# Altium footprint library DBLib.PcbLib: 99 footprints (part 6 of 7)
Each footprint in its own frame and in the unit in brackets; x right, y up, seen from the top. Pads: shape width x height; smd on the part's side, far side on the other; paste and mask are expansions set on the pad; w line width, h text height; cw(c..) or ccw(c..) is an arc to the next point about the centre after c.
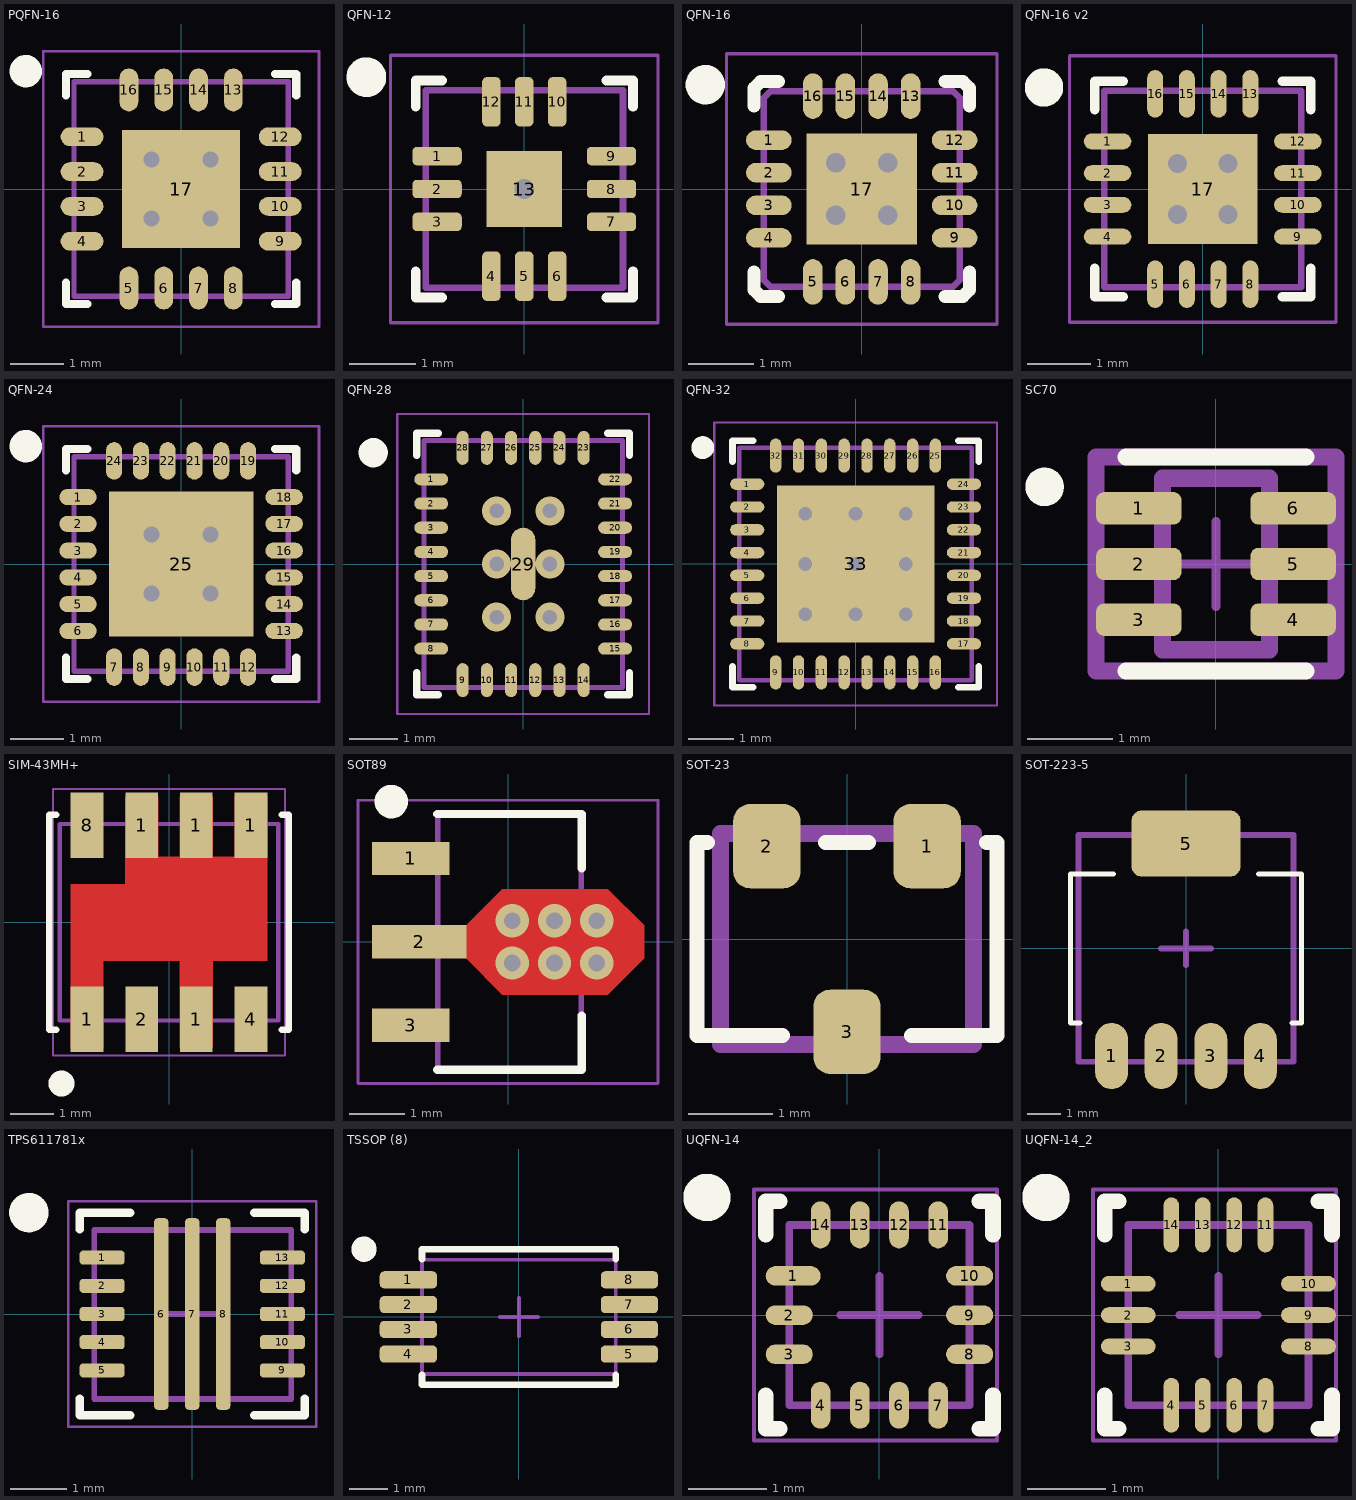
[diagram p5: the footprints below, top view; thin cyan lines are the x and y axes]

## PQFN-16 [mm] "PQFN, 16-Leads, Body 4,00x4,00mm, Pitch 0,65mm, Thermal Pad 2,15x2,15mm, IPC Medium Density"
height 0.8
pads (17):
  oval 0.8x0.35 smd: 1(-1.85,0.975) 2(-1.85,0.325) 3(-1.85,-0.325) 4(-1.85,-0.975) 9(1.85,-0.975) 10(1.85,-0.325) 11(1.85,0.325) 12(1.85,0.975)
  oval 0.35x0.8 smd: 5(-0.975,-1.85) 6(-0.325,-1.85) 7(0.325,-1.85) 8(0.975,-1.85) 13(0.975,1.85) 14(0.325,1.85) 15(-0.325,1.85) 16(-0.975,1.85)
  rect 2.2x2.2 all layers, no hole mask+0.102: 17(0,0)
via 0.55,0.55 diameter 0.6 hole 0.3
via -0.55,0.55 diameter 0.6 hole 0.3
via -0.55,-0.55 diameter 0.6 hole 0.3
via 0.55,-0.55 diameter 0.6 hole 0.3
Top Overlay:
  circle w0.35: c-2.9,2.2 r0.127
  lines w0.15: -2.15,-1.75 -2.15,-2.15 -1.75,-2.15 ; -2.15,1.75 -2.15,2.15 -1.75,2.15 ; 1.75,-2.15 2.15,-2.15 2.15,-1.75 ; 1.75,2.15 2.15,2.15 2.15,1.75
Mechanical 1:
  lines w0.05: -2.575,-2.575 2.575,-2.575 2.575,2.575 -2.575,2.575 -2.575,-2.575
  lines w0.1: -0.5,0 0.5,0 ; 0,-0.5 0,0.5 ; -2,-2 2,-2 2,2 -2,2 -2,-2
3D body "ALSRobot-QFN16 4x4.step": height 0.92, standoff 0, extent -2,-2 2,2

## QFN-12 [mm]
pads (13):
  rrect50% 0.75x0.28 smd: 1(-1.325,0.5) 2(-1.325,0) 3(-1.325,-0.5) 7(1.325,-0.5) 8(1.325,0) 9(1.325,0.5)
  rrect50% 0.28x0.75 smd: 4(-0.5,-1.325) 5(0,-1.325) 6(0.5,-1.325) 10(0.5,1.325) 11(0,1.325) 12(-0.5,1.325)
  rect 1.15x1.15 all layers, no hole mask+0.102: 13(0,0)
via 0,0 diameter 0.6 hole 0.3
Top Overlay:
  circle w0.35: c-2.4,1.7 r0.127
  lines w0.15: -1.65,-1.25 -1.65,-1.65 -1.25,-1.65 ; -1.65,1.25 -1.65,1.65 -1.25,1.65 ; 1.25,-1.65 1.65,-1.65 1.65,-1.25 ; 1.25,1.65 1.65,1.65 1.65,1.25
Mechanical 1:
  lines w0.05: -2.032,-2.032 -2.032,2.032 2.032,2.032 2.032,-2.032 -2.032,-2.032
  lines w0.1: -0.5,0 0.5,0 ; 0,-0.5 0,0.5 ; -1.5,-1.5 -1.5,1.5 1.5,1.5 1.5,-1.5 -1.5,-1.5
3D body "User Library-QFN12_05.step": height 0.9, standoff 0, extent -1.505,-1.505 1.505,1.505

## QFN-16 [mm] "QFN, 16-Leads, Body 3,00x3,00mm, Pitch 0,50mm, Thermal Pad 1,70x1,70mm, IPC Medium Density"
height 0.9
pads (17):
  oval 0.7x0.3 smd: 1(-1.425,0.75) 2(-1.425,0.25) 3(-1.425,-0.25) 4(-1.425,-0.75) 9(1.425,-0.75) 10(1.425,-0.25) 11(1.425,0.25) 12(1.425,0.75)
  oval 0.3x0.7 smd: 5(-0.75,-1.425) 6(-0.25,-1.425) 7(0.25,-1.425) 8(0.75,-1.425) 13(0.75,1.425) 14(0.25,1.425) 15(-0.25,1.425) 16(-0.75,1.425)
  rect 1.7x1.7 all layers, no hole mask+0.102: 17(0,0)
via -0.4,0.4 diameter 0.6 hole 0.3
via -0.4,-0.4 diameter 0.6 hole 0.3
via 0.4,-0.4 diameter 0.6 hole 0.3
via 0.4,0.4 diameter 0.6 hole 0.3
Top Overlay:
  circle w0.35: c-2.4,1.6 r0.127
  lines w0.2: -1.65,-1.275 -1.65,-1.55 -1.55,-1.65 -1.275,-1.65 ; -1.65,1.275 -1.65,1.55 -1.55,1.65 -1.275,1.65 ; 1.275,-1.65 1.55,-1.65 1.65,-1.55 1.65,-1.275 ; 1.275,1.65 1.55,1.65 1.65,1.55 1.65,1.275
Mechanical 1:
  lines w0.05: -2.075,-2.075 2.075,-2.075 2.075,2.075 -2.075,2.075 -2.075,-2.075
  lines w0.1: -0.5,0 0.5,0 ; 0,-0.5 0,0.5 ; -1.5,-1.4 -1.5,1.4 -1.4,1.5 1.4,1.5 1.5,1.4 1.5,-1.4 1.4,-1.5 -1.4,-1.5 -1.5,-1.4
3D body "User Library-qfn16-3x3.step": height 0.92, standoff 0, extent -1.5,-1.5 1.5,1.5

## QFN-16 v2 [mm] "QFN, 16-Leads, Body 3,00x3,00mm, Pitch 0,50mm, Thermal Pad 1,73x1,73mm, IPC Medium Density"
height 1
pads (17):
  oval 0.75x0.25 smd: 1(-1.5,0.75) 2(-1.5,0.25) 3(-1.5,-0.25) 4(-1.5,-0.75) 9(1.5,-0.75) 10(1.5,-0.25) 11(1.5,0.25) 12(1.5,0.75)
  oval 0.25x0.75 smd: 5(-0.75,-1.5) 6(-0.25,-1.5) 7(0.25,-1.5) 8(0.75,-1.5) 13(0.75,1.5) 14(0.25,1.5) 15(-0.25,1.5) 16(-0.75,1.5)
  rect 1.73x1.73 all layers, no hole mask+0.102: 17(0,0)
via 0.4,0.4 diameter 0.6 hole 0.3
via 0.4,-0.4 diameter 0.6 hole 0.3
via -0.4,-0.4 diameter 0.6 hole 0.3
via -0.4,0.4 diameter 0.6 hole 0.3
Top Overlay:
  circle w0.35: c-2.5,1.6 r0.127
  lines w0.15: -1.7,-1.25 -1.7,-1.7 -1.25,-1.7 ; -1.7,1.25 -1.7,1.7 -1.25,1.7 ; 1.25,-1.7 1.7,-1.7 1.7,-1.25 ; 1.25,1.7 1.7,1.7 1.7,1.25
Mechanical 1:
  lines w0.05: -2.1,-2.1 -2.1,2.1 2.1,2.1 2.1,-2.1 -2.1,-2.1
  lines w0.1: -0.5,0 0.5,0 ; 0,-0.5 0,0.5 ; -1.55,-1.55 -1.55,1.55 1.55,1.55 1.55,-1.55 -1.55,-1.55
3D body "User Library-HMC713LP3.step": height 1, standoff 0, extent -1.5,-1.5 1.5,1.5

## QFN-24 [mm] "QFN, 24-Leads, Body 4,00x4,00mm, Pitch 0,50mm, Thermal Pad 2,70x2,70mm, IPC Medium Density"
height 0.9
pads (25):
  oval 0.7x0.3 smd: 1(-1.925,1.25) 2(-1.925,0.75) 3(-1.925,0.25) 4(-1.925,-0.25) 5(-1.925,-0.75) 6(-1.925,-1.25) 13(1.925,-1.25) 14(1.925,-0.75) 15(1.925,-0.25) 16(1.925,0.25) 17(1.925,0.75) 18(1.925,1.25)
  oval 0.3x0.7 smd: 7(-1.25,-1.925) 8(-0.75,-1.925) 9(-0.25,-1.925) 10(0.25,-1.925) 11(0.75,-1.925) 12(1.25,-1.925) 19(1.25,1.925) 20(0.75,1.925) 21(0.25,1.925) 22(-0.25,1.925) 23(-0.75,1.925) 24(-1.25,1.925)
  rect 2.7x2.7 all layers, no hole mask+0.102: 25(0,0)
via 0.55,-0.55 diameter 0.6 hole 0.3
via -0.55,-0.55 diameter 0.6 hole 0.3
via -0.55,0.55 diameter 0.6 hole 0.3
via 0.55,0.55 diameter 0.6 hole 0.3
Top Overlay:
  circle w0.35: c-2.9,2.2 r0.127
  lines w0.15: -2.15,-1.75 -2.15,-2.15 -1.75,-2.15 ; -2.15,1.75 -2.15,2.15 -1.75,2.15 ; 1.75,-2.15 2.15,-2.15 2.15,-1.75 ; 1.75,2.15 2.15,2.15 2.15,1.75
Mechanical 1:
  lines w0.05: -2.575,-2.575 -2.575,2.575 2.575,2.575 2.575,-2.575 -2.575,-2.575
  lines w0.1: -0.5,0 0.5,0 ; 0,-0.5 0,0.5 ; -2,-2 -2,2 2,2 2,-2 -2,-2
3D body "User Library-QFN24.step": height 0.9, standoff 0, extent -2.005,-2.005 2.005,2.005

## QFN-28 [mm] "QFN, 28-Leads, Body 4,00x5,00mm, Pitch 0,50mm, Thermal Pad 2,50x3,50mm, IPC Medium Density"
height 0.9
pads (29):
  oval 0.7x0.25 smd: 1(-1.9,1.75) 2(-1.9,1.25) 3(-1.9,0.75) 4(-1.9,0.25) 5(-1.9,-0.25) 6(-1.9,-0.75) 7(-1.9,-1.25) 8(-1.9,-1.75) 15(1.9,-1.75) 16(1.9,-1.25) 17(1.9,-0.75) 18(1.9,-0.25) 19(1.9,0.25) 20(1.9,0.75) 21(1.9,1.25) 22(1.9,1.75)
  oval 0.25x0.7 smd: 9(-1.25,-2.4) 10(-0.75,-2.4) 11(-0.25,-2.4) 12(0.25,-2.4) 13(0.75,-2.4) 14(1.25,-2.4) 23(1.25,2.4) 24(0.75,2.4) 25(0.25,2.4) 26(-0.25,2.4) 27(-0.75,2.4) 28(-1.25,2.4)
  oval 0.5x1.5 all layers, no hole mask+0.102: 29(0,0)
via 0.55,-1.1 diameter 0.6 hole 0.3
via -0.55,-1.1 diameter 0.6 hole 0.3
via 0.55,0 diameter 0.6 hole 0.3
via -0.55,0 diameter 0.6 hole 0.3
via 0.55,1.1 diameter 0.6 hole 0.3
via -0.55,1.1 diameter 0.6 hole 0.3
Top Overlay:
  circle w0.35: c-3.1,2.3 r0.127
  lines w0.15: -2.2,-2.25 -2.2,-2.7 -1.75,-2.7 ; -2.2,2.25 -2.2,2.7 -1.75,2.7 ; 1.75,-2.7 2.2,-2.7 2.2,-2.25 ; 1.75,2.7 2.2,2.7 2.2,2.25
Mechanical 1:
  lines w0.05: -2.6,-3.1 -2.6,3.1 2.6,3.1 2.6,-3.1 -2.6,-3.1
  lines w0.1: -0.5,0 0.5,0 ; 0,-0.5 0,0.5 ; -2.05,-2.55 -2.05,2.55 2.05,2.55 2.05,-2.55 -2.05,-2.55
Multi-Layer:
  region: -1.325,1.469 -1.325,-1.825 1.325,-1.825 1.325,1.825 -0.969,1.825
3D body "User Library-QFN 28.step": height 0.75, standoff 0, extent -2.005,-2.505 2.005,2.505

## QFN-32 [mm] "QFN, 32-Leads, Body 5,00x5,00mm, Pitch 0,50mm, Thermal Pad 3,45x3,45mm, IPC Medium Density"
height 0.75
pads (33):
  oval 0.75x0.25 smd: 1(-2.375,1.75) 2(-2.375,1.25) 3(-2.375,0.75) 4(-2.375,0.25) 5(-2.375,-0.25) 6(-2.375,-0.75) 7(-2.375,-1.25) 8(-2.375,-1.75) 17(2.375,-1.75) 18(2.375,-1.25) 19(2.375,-0.75) 20(2.375,-0.25) 21(2.375,0.25) 22(2.375,0.75) 23(2.375,1.25) 24(2.375,1.75)
  oval 0.25x0.75 smd: 9(-1.75,-2.375) 10(-1.25,-2.375) 11(-0.75,-2.375) 12(-0.25,-2.375) 13(0.25,-2.375) 14(0.75,-2.375) 15(1.25,-2.375) 16(1.75,-2.375) 25(1.75,2.375) 26(1.25,2.375) 27(0.75,2.375) 28(0.25,2.375) 29(-0.25,2.375) 30(-0.75,2.375) 31(-1.25,2.375) 32(-1.75,2.375)
  rect 3.45x3.45 all layers, no hole mask+0.102: 33(0,0)
via -1.1,1.1 diameter 0.6 hole 0.3
via 0,1.1 diameter 0.6 hole 0.3
via 1.1,1.1 diameter 0.6 hole 0.3
via -1.1,0 diameter 0.6 hole 0.3
via 0,0 diameter 0.6 hole 0.3
via 1.1,0 diameter 0.6 hole 0.3
via -1.1,-1.1 diameter 0.6 hole 0.3
via 0,-1.1 diameter 0.6 hole 0.3
via 1.1,-1.1 diameter 0.6 hole 0.3
Top Overlay:
  circle w0.25: c-3.35,2.55 r0.125
  lines w0.15: -2.7,-2.25 -2.7,-2.7 -2.25,-2.7 ; -2.7,2.25 -2.7,2.7 -2.25,2.7 ; 2.25,-2.7 2.7,-2.7 2.7,-2.25 ; 2.25,2.7 2.7,2.7 2.7,2.25
Mechanical 1:
  lines w0.05: -3.1,-3.1 -3.1,3.1 3.1,3.1 3.1,-3.1 -3.1,-3.1
  lines w0.1: -0.5,0 0.5,0 ; 0,-0.5 0,0.5 ; -2.55,-2.55 -2.55,2.55 2.55,2.55 2.55,-2.55 -2.55,-2.55
3D body "User Library-QFN-32UH.step": height 0.75, standoff 0, extent -2.51,-2.51 2.51,2.51

## SC70 [mm]
height 1
pads (6):
  rrect50% 1x0.376 smd paste+0 mask+0: 1(-0.9,0.65) 2(-0.9,0) 3(-0.9,-0.65) 4(0.9,-0.65) 5(0.9,0) 6(0.9,0.65)
Top Overlay:
  circle w0.25: c-2,0.9 r0.1
  lines w0.2: -1.05,-1.25 1.05,-1.25 ; -1.05,1.25 1.05,1.25
Mechanical 1:
  lines w0.2: -0.625,-1 0.625,-1 0.625,1 -0.625,1 -0.625,-1
Mechanical 13:
  lines w0.1: -0.5,0 0.5,0 ; 0,-0.5 0,0.5
  lines w0.2: -1.4,-1.25 -1.4,1.25 1.4,1.25 1.4,-1.25 -1.4,-1.25
3D body "IC_Analog_Devices_LT5534ESC6#TRMPBF_eec.STEP": height 1, standoff 0, extent -1.069,-1.003 1.031,0.997

## SIM-43MH+ [mm] "Frequency Mixer"
height 2.21
pads (8):
  rect 0.76x1.52 smd: 1(-1.905,-2.256) 1(-0.635,2.256) 1(0.635,-2.256) 1(0.635,2.256) 1(1.905,2.256) 2(-0.635,-2.256) 4(1.905,-2.256) 8(-1.905,2.256)
Top Layer:
  region: -1.016,2.921 -0.254,2.921 -0.254,1.524 0.254,1.524 0.254,2.921 1.016,2.921 1.016,1.524 1.524,1.524 1.524,2.921 2.286,2.921 2.286,-0.889 1.016,-0.889 1.016,-2.921 0.254,-2.921 0.254,-0.889 -1.524,-0.889 -1.524,-2.921 -2.286,-2.921 -2.286,0.889 -1.016,0.889
Top Overlay:
  circle w0.35: c-2.5,-3.75 r0.127
  lines w0.15: -2.626,-2.5 -2.786,-2.5 -2.786,2.5 -2.626,2.5 ; 2.626,-2.5 2.786,-2.5 2.786,2.5 2.626,2.5
Mechanical 1:
  lines w0.05: -2.7,-3.1 2.7,-3.1 2.7,3.1 -2.7,3.1 -2.7,-3.1
  lines w0.1: -0.5,0 0.5,0 ; 0,-0.5 0,0.5 ; -2.54,-2.285 -2.54,2.285 2.54,2.285 2.54,-2.285 -2.54,-2.285
3D body "SIM-73L+.stp": height 2.21, standoff -0.05, extent -2.54,-2.285 2.54,2.285

## SOT89 [mm] "SOT89, 3-Leads, Body 4,49x2,44mm, Pitch 1,50mm, Lead Span 4,0mm, IPC Medium Density"
height 1.6
pads (3):
  rect 1.4x0.6 smd: 1(-1.75,1.5) 3(-1.75,-1.5)
  rect 1.7x0.6 smd: 2(-1.6,0)
via 1.6,-0.381 diameter 0.6 hole 0.3
via 1.6,0.381 diameter 0.6 hole 0.3
via 0.838,0.381 diameter 0.6 hole 0.3
via 0.838,-0.381 diameter 0.6 hole 0.3
via 0.076,-0.381 diameter 0.6 hole 0.3
via 0.076,0.381 diameter 0.6 hole 0.3
Top Layer:
  region: -0.75,0.3 -0.1,0.95 1.8,0.95 2.45,0.3 2.45,-0.3 1.8,-0.95 -0.1,-0.95 -0.75,-0.3
Top Overlay:
  circle w0.35: c-2.1,2.525 r0.127
  lines w0.15: -1.272,-2.3 1.328,-2.3 1.328,-1.325 ; -1.272,2.3 1.328,2.3 1.328,1.325
Mechanical 1:
  lines w0.05: -2.7,-2.55 2.7,-2.55 2.7,2.55 -2.7,2.55 -2.7,-2.55
  lines w0.1: -0.473,0 0.527,0 ; 0.028,-0.5 0.028,0.5 ; -1.268,-2.3 1.322,-2.3 1.322,2.3 -1.268,2.3 -1.268,-2.3
Multi-Layer:
  region: -0.75,0.3 -0.1,0.95 1.8,0.95 2.45,0.3 2.45,-0.3 1.8,-0.95 -0.1,-0.95 -0.75,-0.3
3D body "User Library-SOT89-3.STEP": height 1.54, standoff 0, extent -2.222,-2.25 2.028,2.25

## SOT-23 [mm]
height 1
pads (3):
  rrect50% 0.8x1 smd: 1(0.95,1.1) 2(-0.95,1.1) 3(0,-1.1)
Top Overlay:
  lines w0.178: -1.651,1.143 -1.778,1.143 -1.778,-1.143 -0.762,-1.143 ; -0.254,1.143 0.254,1.143 ; 0.762,-1.143 1.778,-1.143 1.778,1.143 1.651,1.143
Mechanical 1:
  lines w0.2: -1.5,-1.25 -1.5,1.25 1.5,1.25 1.5,-1.25 -1.5,-1.25
3D body "SOT23-3_TO-236AB.step": height 1.09, standoff 0, extent -1.5,-1.25 1.5,1.25

## SOT-223-5 [mm]
height 1.8
pads (5):
  oval 1x2 smd: 1(-2.25,-3.252) 2(-0.75,-3.252) 3(0.75,-3.252) 4(2.25,-3.252)
  rrect30% 3.3x2 smd: 5(0,3.175)
Top Overlay:
  lines w0.15: -3.2,-2.252 -3.5,-2.252 -3.5,2.248 -2.2,2.248 ; 2.2,2.248 3.5,2.248 3.5,-2.252 3.2,-2.252
Mechanical 1:
  lines w0.178: -0.762,0 0.762,0 ; 0,-0.508 0,0.508 ; -3.25,-3.429 3.25,-3.429 3.25,3.429 -3.25,3.429 -3.25,-3.429
3D body "User Library-User Library-SOT-223-5.step": height 1.63, standoff -0.02, extent -3.25,-3.5 3.25,3.5

## TPS611781x [mm] "QFN, 24-Leads, Body 4,00x4,00mm, Pitch 0,50mm, PLASTIC SMALL OUTLINE - NO LEAD"
height 1
pads (13):
  rrect50% 0.8x0.25 smd: 1(-1.6,1) 2(-1.6,0.5) 3(-1.6,0) 4(-1.6,-0.5) 5(-1.6,-1) 9(1.6,-1) 10(1.6,-0.5) 11(1.6,0) 12(1.6,0.5) 13(1.6,1)
  rrect50% 0.25x3.4 smd: 6(-0.55,0) 7(0,0) 8(0.55,0)
Top Overlay:
  circle w0.35: c-2.9,1.8 r0.175
  lines w0.15: -2,-1.5 -2,-1.8 -1.1,-1.8 ; -2,1.5 -2,1.8 -1.1,1.8 ; 1.1,-1.8 2,-1.8 2,-1.5 ; 1.1,1.8 2,1.8 2,1.5
Mechanical 1:
  lines w0.05: -2.2,-2 2.2,-2 2.2,2 -2.2,2 -2.2,-2
  lines w0.1: -0.5,0 0.5,0 ; 0,-0.5 0,0.5 ; -1.74,-1.51 1.76,-1.51 1.76,1.49 -1.74,1.49 -1.74,-1.51
3D body: height 1, standoff 0, extent -1.74,-1.51 1.76,1.49
3D body: height 1.02, standoff 1, extent -1.4,0.9 -1.2,1.1

## TSSOP (8) [mm] "TSSOP, 8-Leads"
height 1.2
pads (8):
  rrect50% 1.5x0.45 smd: 1(-2.9,0.975) 2(-2.9,0.325) 3(-2.9,-0.325) 4(-2.9,-0.975) 5(2.9,-0.975) 6(2.9,-0.325) 7(2.9,0.325) 8(2.9,0.975)
Top Overlay:
  circle w0.35: c-4.064,1.778 r0.156
  lines w0.178: -2.54,-1.524 -2.54,-1.778 2.54,-1.778 2.54,-1.524 ; -2.54,1.524 -2.54,1.778 2.54,1.778 2.54,1.524
Mechanical 1:
  lines w0.1: -0.5,0 0.5,0 ; 0,-0.5 0,0.5 ; -2.54,-1.5 2.54,-1.5 2.54,1.5 -2.54,1.5 -2.54,-1.5
3D body "User Library-TSSOP-8.STEP": height 1.2, standoff 0, extent -3.2,-1.5 3.2,1.5

## UQFN-14 [mm] "LMH5401"
height 0.6
pads (14):
  oval 0.7x0.25 smd: 1(-1.1,0.5)
  oval 0.6x0.25 smd: 2(-1.15,0) 3(-1.15,-0.5) 8(1.15,-0.5) 9(1.15,0) 10(1.15,0.5)
  oval 0.25x0.6 smd: 4(-0.75,-1.15) 5(-0.25,-1.15) 6(0.25,-1.15) 7(0.75,-1.15) 11(0.75,1.15) 12(0.25,1.15) 13(-0.25,1.15) 14(-0.75,1.15)
Top Overlay:
  circle w0.35: c-2.2,1.5 r0.127
  lines w0.2: -1.45,-1.025 -1.45,-1.45 -1.275,-1.45 ; -1.45,1.025 -1.45,1.45 -1.275,1.45 ; 1.275,-1.45 1.45,-1.45 1.45,-1.025 ; 1.275,1.45 1.45,1.45 1.45,1.025
Mechanical 1:
  lines w0.05: -1.6,-1.6 1.5,-1.6 1.5,1.6 -1.6,1.6 -1.6,-1.6
  lines w0.1: -0.5,0 0.5,0 ; 0,-0.5 0,0.5 ; -1.15,-1.15 1.15,-1.15 1.15,1.15 -1.15,1.15 -1.15,-1.15
3D body: height 0.6, standoff 0, extent -1.3,-1.3 1.3,1.3

## UQFN-14_2 [mm] "LMH6554"
height 0.6
pads (14):
  oval 0.7x0.2 smd: 1(-1.15,0.4) 2(-1.15,0) 3(-1.15,-0.4) 8(1.15,-0.4) 9(1.15,0) 10(1.15,0.4)
  oval 0.2x0.7 smd: 4(-0.6,-1.15) 5(-0.2,-1.15) 6(0.2,-1.15) 7(0.6,-1.15) 11(0.6,1.15) 12(0.2,1.15) 13(-0.2,1.15) 14(-0.6,1.15)
Top Overlay:
  circle w0.35: c-2.2,1.5 r0.127
  lines w0.2: -1.45,-1.025 -1.45,-1.45 -1.275,-1.45 ; -1.45,1.025 -1.45,1.45 -1.275,1.45 ; 1.275,-1.45 1.45,-1.45 1.45,-1.025 ; 1.275,1.45 1.45,1.45 1.45,1.025
Mechanical 1:
  lines w0.05: -1.6,-1.6 -1.6,1.6 1.5,1.6 1.5,-1.6 -1.6,-1.6
  lines w0.1: -0.5,0 0.5,0 ; 0,-0.5 0,0.5 ; -1.15,-1.15 -1.15,1.15 1.15,1.15 1.15,-1.15 -1.15,-1.15
3D body: height 0.6, standoff 0, extent -1.3,-1.3 1.3,1.3